# Altium footprint library main.PcbLib: 208 footprints (part 8 of 13)
Each footprint in its own frame and in the unit in brackets; x right, y up, seen from the top. Pads: shape width x height; smd on the part's side, far side on the other; paste and mask are expansions set on the pad; w line width, h text height; cw(c..) or ccw(c..) is an arc to the next point about the centre after c.
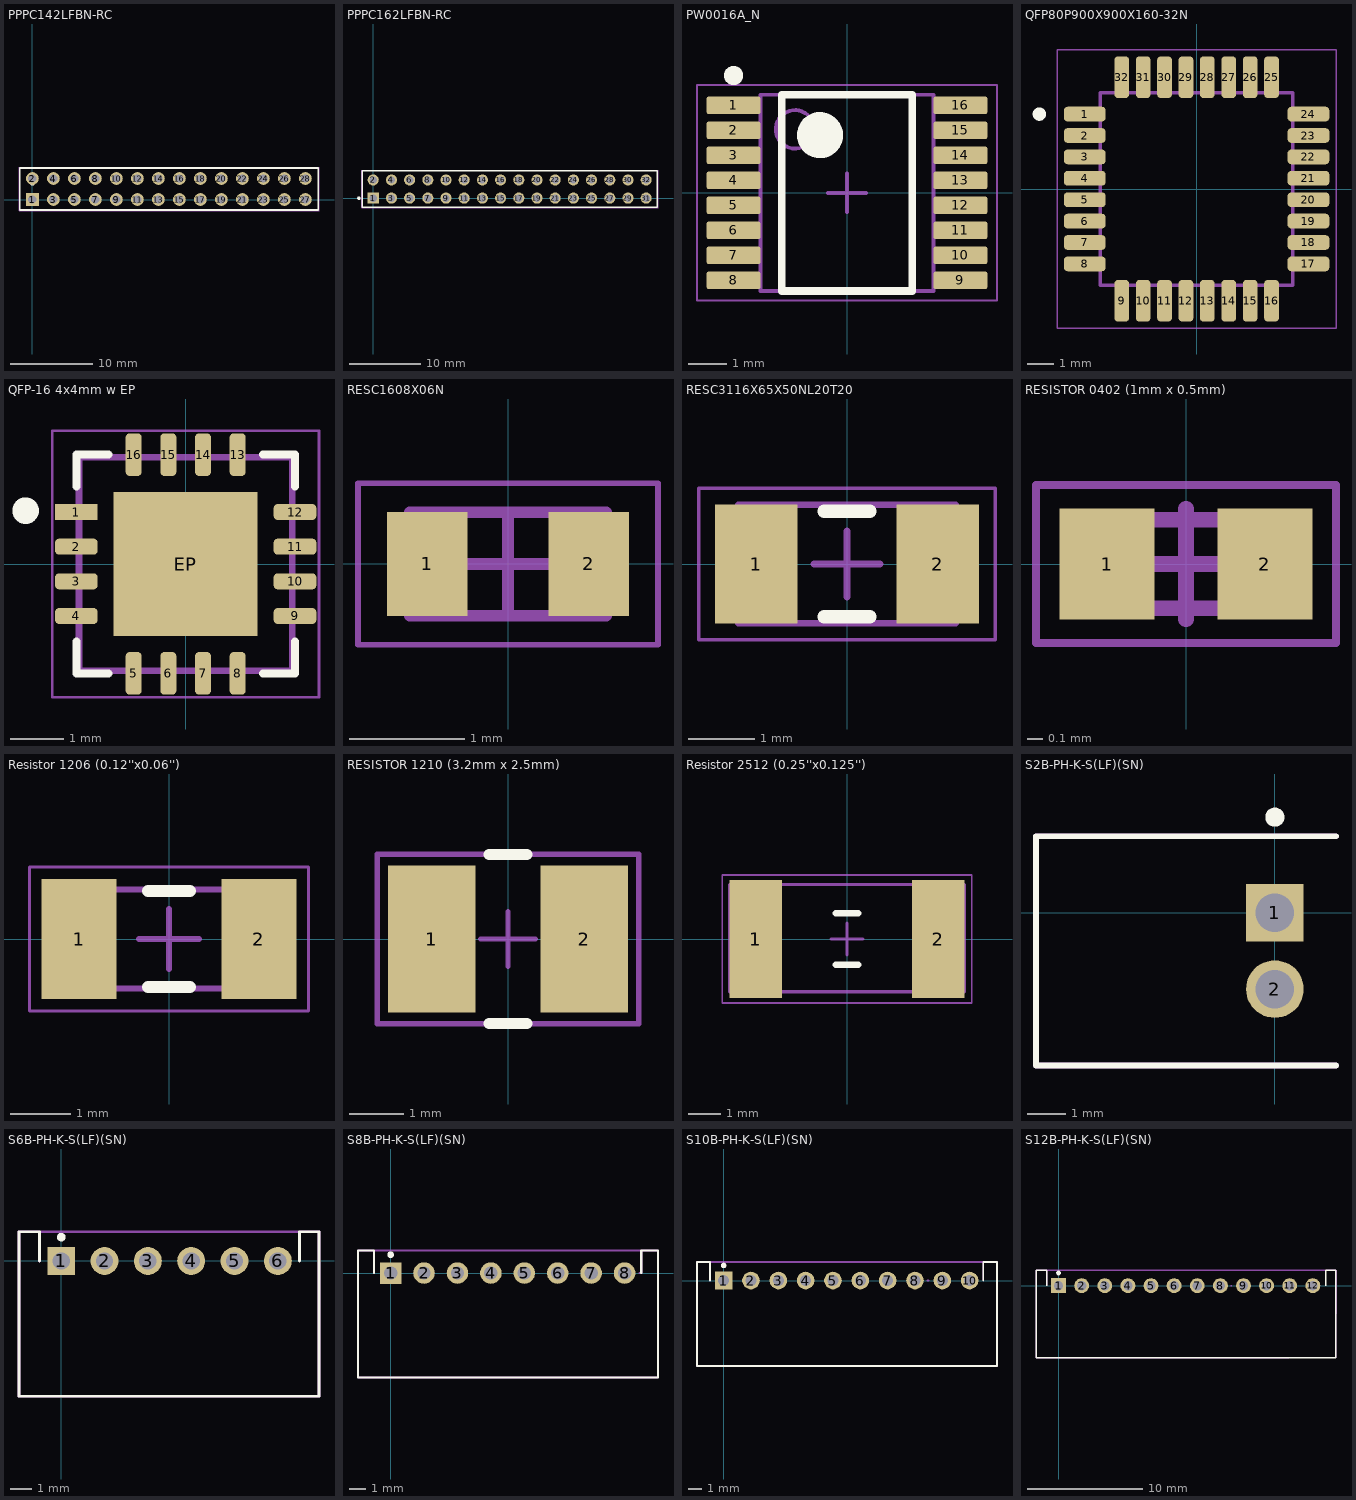
[diagram p7: the footprints below, top view; thin cyan lines are the x and y axes]

## PPPC142LFBN-RC [mm] "THD, 28-Leads"
height 8.5
pads (28):
  rect 1.55x1.55 hole 1.02: 1(0,0)
  round 1.55 hole 1.02: 2(0,2.54) 3(2.54,0) 4(2.54,2.54) 5(5.08,0) 6(5.08,2.54) 7(7.62,0) 8(7.62,2.54) 9(10.16,0) 10(10.16,2.54) 11(12.7,0) 12(12.7,2.54) 13(15.24,0) 14(15.24,2.54) 15(17.78,0) 16(17.78,2.54) 17(20.32,0) 18(20.32,2.54) 19(22.86,0) 20(22.86,2.54) 21(25.4,0) 22(25.4,2.54) 23(27.94,0) 24(27.94,2.54) 25(30.48,0) 26(30.48,2.54) 27(33.02,0) 28(33.02,2.54)
Top Overlay:
  circle w0.25: c0,1.92 r0.125
  lines w0.2: -1.52,-1.27 34.56,-1.27 34.56,3.81 -1.52,3.81 -1.52,-1.27
Mechanical 7:
  text ".Designator" at 1.052,-0.686 h1.52
Mechanical 15:
  lines w0.05: -1.62,-1.37 34.671,-1.37 34.671,3.912 -1.62,3.912 -1.62,-1.37

## PPPC162LFBN-RC [mm] "THD, 32-Leads"
height 8.5
pads (32):
  rect 1.55x1.55 hole 1.02: 1(0,0)
  round 1.55 hole 1.02: 2(0,2.54) 3(2.54,0) 4(2.54,2.54) 5(5.08,0) 6(5.08,2.54) 7(7.62,0) 8(7.62,2.54) 9(10.16,0) 10(10.16,2.54) 11(12.7,0) 12(12.7,2.54) 13(15.24,0) 14(15.24,2.54) 15(17.78,0) 16(17.78,2.54) 17(20.32,0) 18(20.32,2.54) 19(22.86,0) 20(22.86,2.54) 21(25.4,0) 22(25.4,2.54) 23(27.94,0) 24(27.94,2.54) 25(30.48,0) 26(30.48,2.54) 27(33.02,0) 28(33.02,2.54) 29(35.56,0) 30(35.56,2.54) 31(38.1,0) 32(38.1,2.54)
Top Overlay:
  circle w0.25: c-2,0 r0.125
  lines w0.2: -1.52,-1.27 -1.52,3.81 39.64,3.81 39.64,-1.27 -1.52,-1.27
Mechanical 7:
  text ".Designator" at 1.052,-0.686 h1.52
Mechanical 15:
  lines w0.05: -1.62,-1.37 -1.62,3.912 39.751,3.912 39.751,-1.37 -1.62,-1.37

## PW0016A_N [mm] "SOP, 16-Leads, Body 5.1x4.5mm, Pitch 0.65mm, IPC Medium Density"
height 1.2
pads (16):
  rrect22% 1.4x0.45 smd: 1(-2.95,2.275) 2(-2.95,1.625) 3(-2.95,0.975) 4(-2.95,0.325) 5(-2.95,-0.325) 6(-2.95,-0.975) 7(-2.95,-1.625) 8(-2.95,-2.275) 9(2.95,-2.275) 10(2.95,-1.625) 11(2.95,-0.975) 12(2.95,-0.325) 13(2.95,0.325) 14(2.95,0.975) 15(2.95,1.625) 16(2.95,2.275)
Top Overlay:
  circle w0.25: c-2.95,3.05 r0.125
  circle w0.6: c-0.7,1.5 r0.3
  lines w0.2: -1.7,-2.55 -1.7,2.55 1.7,2.55 1.7,-2.55 -1.7,-2.55
Mechanical 1:
Mechanical 7:
  text ".Designator" at -2.73,-0.743 h1.52
Mechanical 13:
  circle w0.1: c-1.35,1.65 r0.5
  lines w0.1: -2.25,-2.55 -2.25,2.55 2.25,2.55 2.25,-2.55 -2.25,-2.55
Mechanical 15:
  lines w0.05: -3.9,-2.8 -3.9,2.8 3.9,2.8 3.9,-2.8 -3.9,-2.8
  lines w0.1: -0.5,0 0.5,0 ; 0,-0.5 0,0.5
3D body "PW0016AakaMTC16.stp": height 1, standoff 0, extent -3.21,-2.5 3.21,2.5

## QFP80P900X900X160-32N [mm]
pads (32):
  rrect50% 1.56x0.55 smd: 1(-4.18,2.8) 2(-4.18,2) 3(-4.18,1.2) 4(-4.18,0.4) 5(-4.18,-0.4) 6(-4.18,-1.2) 7(-4.18,-2) 8(-4.18,-2.8) 17(4.18,-2.8) 18(4.18,-2) 19(4.18,-1.2) 20(4.18,-0.4) 21(4.18,0.4) 22(4.18,1.2) 23(4.18,2) 24(4.18,2.8)
  rrect50% 0.55x1.56 smd: 9(-2.8,-4.18) 10(-2,-4.18) 11(-1.2,-4.18) 12(-0.4,-4.18) 13(0.4,-4.18) 14(1.2,-4.18) 15(2,-4.18) 16(2.8,-4.18) 25(2.8,4.18) 26(2,4.18) 27(1.2,4.18) 28(0.4,4.18) 29(-0.4,4.18) 30(-1.2,4.18) 31(-2,4.18) 32(-2.8,4.18)
Top Overlay:
  circle w0.25: c-5.88,2.8 r0.125
Mechanical 7:
  text ".Designator" at -2.848,-0.671 h1.52
Mechanical 13:
  circle w0.2: c-5.88,2.8 r0.1
  lines w0.127: -3.6,-3.6 3.6,-3.6 3.6,3.6 -3.6,3.6 -3.6,-3.6
Mechanical 15:
  lines w0.05: -5.21,-5.21 5.21,-5.21 5.21,5.21 -5.21,5.21 -5.21,-5.21
3D body "User Library-LQFP32-2.STEP": height 1.62, standoff -0.01, extent -4.572,-4.572 4.572,4.572

## QFP-16 4x4mm w EP [mm] "QFP-16 4x4mm w EP"
height 1
pads (17):
  rect 0.8x0.3 smd: 1(-2.05,0.975)
  rrect50% 0.8x0.3 smd: 2(-2.05,0.325) 3(-2.05,-0.325) 4(-2.05,-0.975) 9(2.05,-0.975) 10(2.05,-0.325) 11(2.05,0.325) 12(2.05,0.975)
  rrect50% 0.3x0.8 smd: 5(-0.975,-2.05) 6(-0.325,-2.05) 7(0.325,-2.05) 8(0.975,-2.05) 13(0.975,2.05) 14(0.325,2.05) 15(-0.325,2.05) 16(-0.975,2.05)
  rect 2.7x2.7 smd: EP(0,0)
Top Overlay:
  circle w0.25: c-3,1 r0.125
  lines w0.152: -2.05,-1.45 -2.05,-2.05 -1.45,-2.05 ; -2.05,1.45 -2.05,2.05 -1.45,2.05 ; 1.45,-2.05 2.05,-2.05 2.05,-1.45 ; 1.45,2.05 2.05,2.05 2.05,1.45
Mechanical 7:
  text ".Designator" at -0.8,-0.5 h1.52
Mechanical 13:
  lines w0.127: -2,-2 -2,2 2,2 2,-2 -2,-2
Mechanical 15:
  lines w0.05: -2.5,-2.5 -2.5,2.5 2.5,2.5 2.5,-2.5 -2.5,-2.5
3D body: height 1, standoff 0, extent -2,-2 2,2

## RESC1608X06N [mm] "Chip Resistor, 2-Leads, Body 1.60x0.80mm, IPC Medium Density"
height 0.55
pads (2):
  rect 0.7x0.9 smd: 1(-0.7,0) 2(0.7,0)
Mechanical 7:
  text ".Designator" at -1.016,-0.254 h0.76
Mechanical 13:
  lines w0.1: -0.85,-0.45 -0.85,0.45 0.85,0.45 0.85,-0.45 -0.85,-0.45
Mechanical 15:
  lines w0.05: -1.3,-0.7 -1.3,0.7 1.3,0.7 1.3,-0.7 -1.3,-0.7
  lines w0.1: -0.45,0 0.45,0 ; 0,-0.45 0,0.45
3D body: height 0.55, standoff 0, extent -0.6,-0.45 0.6,0.45
3D body: height 0.55, standoff 0, extent -0.85,-0.45 -0.6,0.45
3D body: height 0.55, standoff 0, extent 0.6,-0.45 0.85,0.45

## RESC3116X65X50NL20T20 [mm] "Chip Resistor, 2-Leads, Body 3.10x1.60mm, IPC Medium Density"
height 0.65
pads (2):
  rect 1.25x1.8 smd: 1(-1.375,0) 2(1.375,0)
Top Overlay:
  lines w0.2: -0.35,-0.8 0.35,-0.8 ; -0.35,0.8 0.35,0.8
Mechanical 7:
  text ".Designator" at -1.325,-0.454 h0.76
Mechanical 13:
  lines w0.1: -1.65,-0.9 1.65,-0.9 1.65,0.9 -1.65,0.9 -1.65,-0.9
Mechanical 15:
  lines w0.05: -2.25,-1.15 2.25,-1.15 2.25,1.15 -2.25,1.15 -2.25,-1.15
  lines w0.1: -0.5,0 0.5,0 ; 0,-0.5 0,0.5
3D body: height 0.65, standoff 0, extent -1.15,-0.9 1.15,0.9
3D body: height 0.65, standoff 0, extent -1.65,-0.9 -1.15,0.9
3D body: height 0.65, standoff 0, extent 1.15,-0.9 1.65,0.9

## RESISTOR 0402 (1mm x 0.5mm) [mm] "RESISTOR 0402 (1mm x 0.5mm)"
height 0.4
pads (2):
  rect 0.6x0.7 smd: 1(-0.5,0) 2(0.5,0)
Mechanical 7:
  text ".Designator" at -0.66,-0.28 h0.76
Mechanical 13:
  lines w0.1: -0.53,-0.28 -0.53,0.28 0.53,0.28 0.53,-0.28 -0.53,-0.28
Mechanical 15:
  lines w0.05: -0.95,-0.5 -0.95,0.5 0.95,0.5 0.95,-0.5 -0.95,-0.5
  lines w0.1: -0.35,0 0.35,0 ; 0,-0.35 0,0.35
3D body "YAG_R0402_YAG.step": height 0.41, standoff 0, extent -0.533,-0.279 0.533,0.279

## Resistor 1206 (0.12''x0.06'') [mm] "Resistor 1206 (0.12''x0.06'')"
height 0.65
pads (2):
  rect 1.25x2 smd: 1(-1.5,0) 2(1.5,0)
Top Overlay:
  lines w0.2: -0.35,-0.8 0.35,-0.8 ; -0.35,0.8 0.35,0.8
Mechanical 7:
  text ".Designator" at -1.325,-0.454 h0.76
Mechanical 13:
  lines w0.1: -1.6,-0.825 -1.6,0.825 1.6,0.825 1.6,-0.825 -1.6,-0.825
Mechanical 15:
  lines w0.05: -2.325,-1.2 -2.325,1.2 2.325,1.2 2.325,-1.2 -2.325,-1.2
  lines w0.1: -0.5,0 0.5,0 ; 0,-0.5 0,0.5
3D body "CircuitWorks-RESISTOR 1206.step": height 0.53, standoff -0.03, extent -1.6,-0.83 1.6,0.83

## RESISTOR 1210 (3.2mm x 2.5mm) [mm] "RESISTOR 1210 (3.2mm x 2.5mm)"
height 0.65
pads (2):
  rect 1.6x2.7 smd: 1(-1.4,0) 2(1.4,0)
Top Overlay:
  lines w0.2: -0.35,-1.55 0.35,-1.55 ; -0.35,1.55 0.35,1.55
Mechanical 7:
  text ".Designator" at -0.45,-0.95 h0.76
Mechanical 13:
  lines w0.1: -2.4,-1.55 -2.4,1.55 2.4,1.55 2.4,-1.55 -2.4,-1.55
Mechanical 15:
  lines w0.05: -2.4,-1.55 -2.4,1.55 2.4,1.55 2.4,-1.55 -2.4,-1.55
  lines w0.1: -0.5,0 0.5,0 ; 0,-0.5 0,0.5
3D body: height 0.65, standoff 0, extent -1.65,-0.9 -1.15,0.9
3D body: height 0.65, standoff 0, extent 1.15,-0.9 1.65,0.9
3D body "User Library-RESC3225X06N.STEP": height 0.55, standoff 0, extent -1.6,-1.25 1.6,1.25

## Resistor 2512 (0.25''x0.125'') [mm] "Resistor 2512 (0.25''x0.125'')"
height 0.65
pads (2):
  rect 1.65x3.68 smd: 1(-2.85,0) 2(2.85,0)
Top Overlay:
  lines w0.2: -0.35,-0.8 0.35,-0.8 ; -0.35,0.8 0.35,0.8
Mechanical 7:
  text ".Designator" at -1.325,-0.454 h0.76
Mechanical 13:
  lines w0.1: -3.675,-1.65 3.675,-1.65 3.675,1.7 -3.675,1.7 -3.675,-1.65
Mechanical 15:
  lines w0.05: -3.9,-2 3.9,-2 3.9,2 -3.9,2 -3.9,-2
  lines w0.1: -0.5,0 0.5,0 ; 0,-0.5 0,0.5
3D body "User Library-R SMD 2512.STEP": height 0.82, standoff 0.22, extent -3.15,-1.55 3.15,1.6

## S2B-PH-K-S(LF)(SN) [mm]
pads (2):
  rect 1.508x1.508 hole 1: 1(0,0)
  round 1.508 hole 1: 2(0,-2)
Top Overlay:
  circle w0.25: c0,2.5 r0.125
  lines w0.152: 1.6,-4 -6.25,-4 -6.25,2 1.6,2
Mechanical 7:
  text ".Designator" at -5.5,-3.475 h1.52
Mechanical 15:
  lines w0.152: 1.6,-4 -6.25,-4 -6.25,2 1.6,2
3D body "S2B-PH-K-S.STEP": height 4.8, standoff -3.4, extent -6.25,-3.95 1.35,1.95

## S6B-PH-K-S(LF)(SN) [mm] "S6B-PH-K-S(LF)(SN)"
height 1.8
pads (6):
  rect 1.29x1.29 hole 0.8: 1(0,0)
  round 1.29 hole 0.8: 2(2,0) 3(4,0) 4(6,0) 5(8,0) 6(10,0)
Top Overlay:
  circle w0.2: c0,1.1 r0.1
  lines w0.127: -1,0 -1,1.35 -1.95,1.35 -1.95,-6.25 11.9,-6.25 11.9,1.35 11,1.35 11,0
Mechanical 7:
  text ".Designator" at -1.195,-4.27 h1.52
Mechanical 15:
  lines w0.127: -1,0 -1,1.35 -1.95,1.35 ; 11.9,0 11.9,1.35 -1.95,1.35 ; 11.9,1.25 11.9,-6.25 -1.95,-6.25 -1.95,1.35
3D body "S6B-PH-K-S.STEP": height 4.8, standoff -3.4, extent -2,-6.3 11.9,1.3

## S8B-PH-K-S(LF)(SN) [mm] "S8B-PH-K-S(LF)(SN)"
height 1.8
pads (8):
  rect 1.29x1.29 hole 0.8: 1(0,0)
  round 1.29 hole 0.8: 2(2,0) 3(4,0) 4(6,0) 5(8,0) 6(10,0) 7(12,0) 8(14,0)
Top Overlay:
  circle w0.2: c0,1.1 r0.1
  lines w0.127: -1,0 -1,1.35 -1.95,1.35 -1.95,-6.25 16,-6.25 16,1.35 15,1.35 15,0
Mechanical 7:
  text ".Designator" at -1.195,-4.27 h1.52
Mechanical 15:
  lines w0.127: -1,0 -1,1.35 -1.95,1.35 ; 14.9,0 15,0 15,1.35 16,1.35 ; -1.95,1.35 -1.95,-6.25 16,-6.25 16,1.35 ; -1.95,1.35 16,1.35
3D body "S8B-PH-K-S.STEP": height 4.8, standoff -3.4, extent -1.95,-6.25 15.95,1.35

## S10B-PH-K-S(LF)(SN) [mm] "S10B-PH-K-S(LF)(SN)"
height 1.8
pads (10):
  rect 1.29x1.29 hole 0.8: 1(0,0)
  round 1.29 hole 0.8: 2(2,0) 3(4,0) 4(6,0) 5(8,0) 6(10,0) 7(12,0) 8(14,0) 9(16,0) 10(18,0)
Top Overlay:
  circle w0.2: c0,1.1 r0.1
  lines w0.127: -1,0 -1,1.35 -1.95,1.35 -1.95,-6.25 19.94,-6.25 ; 19,0 19,1.35 20,1.35 20,-6.25
Mechanical 7:
  text ".Designator" at -1.195,-4.27 h1.52
Mechanical 15:
  lines w0.127: -1,0 -1,1.35 -1.95,1.35 ; 14.9,0 15,0 ; 18,1.35 19.93,1.35 ; 19,0 19,1.35 -1.95,1.35 ; 19.93,-6.25 -1.95,-6.25 -1.95,1.35 ; 20,-6.25 20,1.35
3D body "S10B-PH-K-S.STEP": height 4.8, standoff -3.4, extent -1.95,-6.24 19.95,1.36

## S12B-PH-K-S(LF)(SN) [mm] "S12B-PH-K-S(LF)(SN)"
height 1.8
pads (12):
  rect 1.29x1.29 hole 0.8: 1(0,0)
  round 1.29 hole 0.8: 2(2,0) 3(4,0) 4(6,0) 5(8,0) 6(10,0) 7(12,0) 8(14,0) 9(16,0) 10(18,0) 11(20,0) 12(22,0)
Top Overlay:
  circle w0.2: c0,1.1 r0.1
  lines w0.127: -1,0 -1,1.35 -1.95,1.35 -1.95,-6.25 24,-6.25 24,1.35 23.1,1.35 23.1,0
Mechanical 7:
  text ".Designator" at -1.195,-4.27 h1.52
Mechanical 15:
  lines w0.127: -1,0 -1,1.35 ; 14.9,0 15,0 ; 19.93,-6.25 -1.95,-6.25 -1.95,1.352 -1.944,1.346 24,1.346 24,0 ; 24,-6.248 24.003,1.346
3D body "S12B-PH-K-S.STEP": height 4.8, standoff -3.4, extent -1.948,-6.254 23.952,1.346